# Altium integrated library Lattice CPLD ispLSI.IntLib: 471 symbols (part 24 of 26) (continued)
## ispLSI8840V-60LB492 (continued)
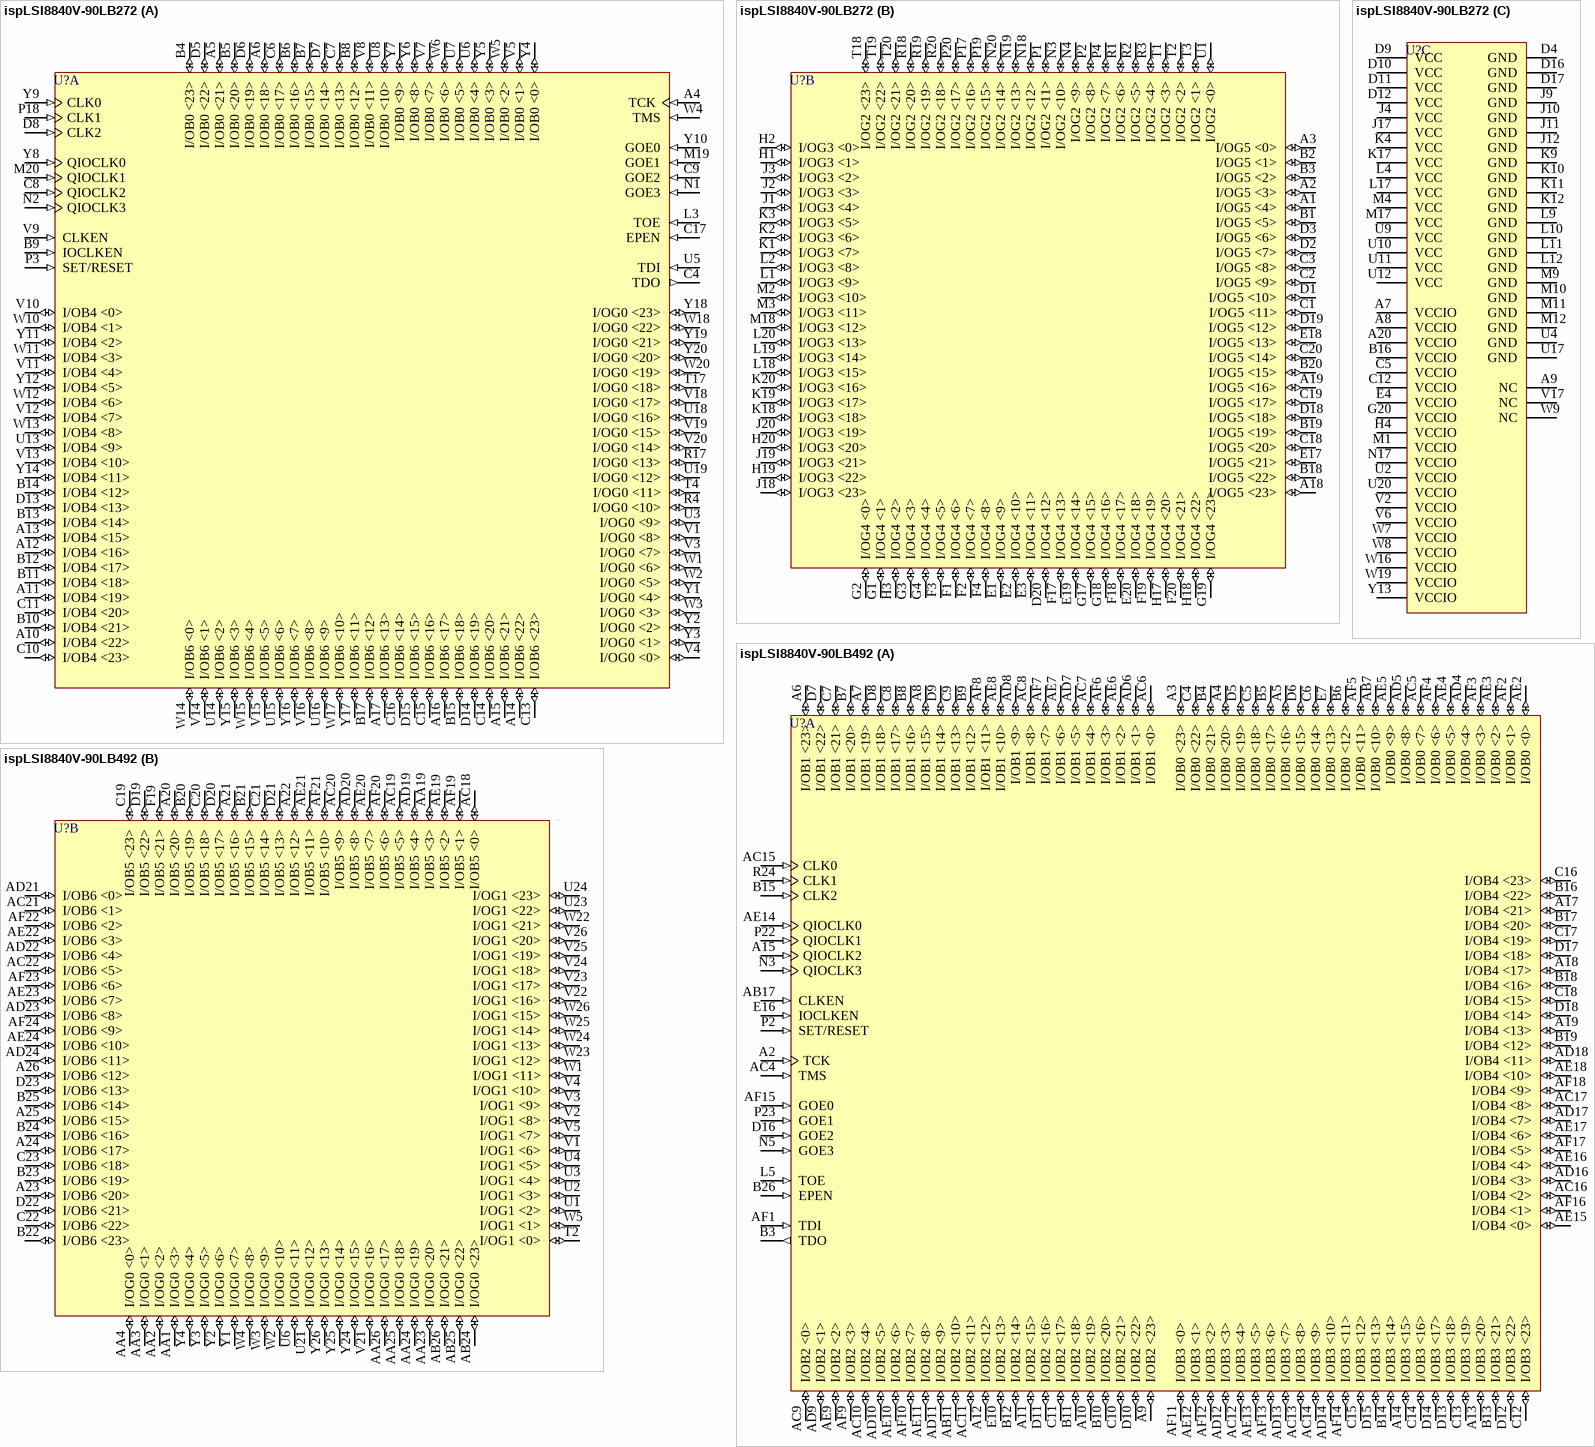
[diagram p223: symbols ispLSI8840V-90LB272 to ispLSI8840V-90LB492]

## ispLSI8840V-90LB272
designator U?
3.3V In-System Programmable SuperBIG High Density PLD; Published: 17-Jul-2002; LatestRevisionDate: 13-Apr-2006; LatestRevisionNote: IPC-7351 Footprint Added.; DatasheetVersion: Nov-2000; PackageVersion: pkg_32, Aug-2005; PackageReference: BGA272; Publisher: Altium Limited; PackageDescription: 272-Ball Ball Grid Array (BGA272); ComponentLink1Description: Manufacturer Link; ComponentLink1URL: http://www.latticesemi.com/products/mature/index.cfm; ComponentLink2Description: Datasheet; ComponentLink2URL: http://www.latticesemi.com/lit/docs/datasheets/cpld/8840v.pdf
footprint BGA272 (BGA, 272-Leads, Body 27x27mm, Pitch 1.27mm)
3D model 8840V-BGA272 (272-Ball Ball Grid Array (BGA272))
part A pins: A4 TCK (in), A5 I/OB0 <21> (io), A6 I/OB0 <18> (io), A10 I/OB4 <22> (io), A11 I/OB4 <19> (io), A12 I/OB4 <16> (io), A13 I/OB4 <15> (io), A14 I/OB6 <22> (io), A15 I/OB6 <21> (io), A16 I/OB6 <17> (io), A17 I/OB6 <13> (io), B4 I/OB0 <23> (io), B5 I/OB0 <20> (io), B6 I/OB0 <16> (io), B7 I/OB0 <15> (io), B8 I/OB0 <12> (io), B9 IOCLKEN (in), B10 I/OB4 <21> (io), B11 I/OB4 <18> (io), B12 I/OB4 <17> (io), B13 I/OB4 <14> (io), B14 I/OB4 <12> (io), B15 I/OB6 <18> (io), B17 I/OB6 <12> (io), C4 TDO (out), C6 I/OB0 <17> (io), C7 I/OB0 <13> (io), C8 QIOCLK2 (in), C9 GOE2 (in), C10 I/OB4 <23> (io), C11 I/OB4 <20> (io), C13 I/OB6 <23> (io), C14 I/OB6 <20> (io), C15 I/OB6 <16> (io), C16 I/OB6 <14> (io), C17 EPEN (in), D5 I/OB0 <22> (io), D6 I/OB0 <19> (io), D7 I/OB0 <14> (io), D8 CLK2 (in), D13 I/OB4 <13> (io), D14 I/OB6 <19> (io), D15 I/OB6 <15> (io), L3 TOE (in), M19 GOE1 (in), M20 QIOCLK1 (in), N1 GOE3 (in), N2 QIOCLK3 (in), P3 SET/RESET (in), P18 CLK1 (in), R4 I/OG0 <10> (io), R17 I/OG0 <13> (io), T4 I/OG0 <11> (io), T17 I/OG0 <18> (io), U3 I/OG0 <9> (io), U5 TDI (in), U6 I/OB0 <4> (io), U7 I/OB0 <5> (io), U8 I/OB0 <10> (io), U13 I/OB4 <9> (io), U14 I/OB6 <2> (io), U15 I/OB6 <6> (io), U16 I/OB6 <9> (io), U18 I/OG0 <16> (io), U19 I/OG0 <12> (io), V1 I/OG0 <8> (io), V3 I/OG0 <7> (io), V4 I/OG0 <0> (io), V5 I/OB0 <1> (io), V7 I/OB0 <7> (io), V8 I/OB0 <11> (io), V9 CLKEN (in), V10 I/OB4 <0> (io), V11 I/OB4 <4> (io), V12 I/OB4 <7> (io), V13 I/OB4 <10> (io), V14 I/OB6 <1> (io), V15 I/OB6 <5> (io), V16 I/OB6 <8> (io), V18 I/OG0 <17> (io), V19 I/OG0 <15> (io), V20 I/OG0 <14> (io), W1 I/OG0 <6> (io), W2 I/OG0 <5> (io), W3 I/OG0 <3> (io), W4 TMS (in), W5 I/OB0 <2> (io), W6 I/OB0 <6> (io), W10 I/OB4 <1> (io), W11 I/OB4 <3> (io), W12 I/OB4 <6> (io), W13 I/OB4 <8> (io), W14 I/OB6 <0> (io), W15 I/OB6 <4> (io), W17 I/OB6 <10> (io), W18 I/OG0 <22> (io), W20 I/OG0 <19> (io), Y1 I/OG0 <4> (io), Y2 I/OG0 <2> (io), Y3 I/OG0 <1> (io), Y4 I/OB0 <0> (io), Y5 I/OB0 <3> (io), Y6 I/OB0 <8> (io), Y7 I/OB0 <9> (io), Y8 QIOCLK0 (in), Y9 CLK0 (in), Y10 GOE0 (in), Y11 I/OB4 <2> (io), Y12 I/OB4 <5> (io), Y14 I/OB4 <11> (io), Y15 I/OB6 <3> (io), Y16 I/OB6 <7> (io), Y17 I/OB6 <11> (io), Y18 I/OG0 <23> (io), Y19 I/OG0 <21> (io), Y20 I/OG0 <20> (io)
part B pins: A1 I/OG5 <4> (io), A2 I/OG5 <3> (io), A3 I/OG5 <0> (io), A18 I/OG5 <23> (io), A19 I/OG5 <16> (io), B1 I/OG5 <5> (io), B2 I/OG5 <1> (io), B3 I/OG5 <2> (io), B18 I/OG5 <22> (io), B19 I/OG5 <19> (io), B20 I/OG5 <15> (io), C1 I/OG5 <11> (io), C2 I/OG5 <9> (io), C3 I/OG5 <8> (io), C18 I/OG5 <20> (io), C19 I/OG5 <17> (io), C20 I/OG5 <14> (io), D1 I/OG5 <10> (io), D2 I/OG5 <7> (io), D3 I/OG5 <6> (io), D18 I/OG5 <18> (io), D19 I/OG5 <12> (io), D20 I/OG4 <12> (io), E1 I/OG4 <9> (io), E2 I/OG4 <10> (io), E3 I/OG4 <11> (io), E17 I/OG5 <21> (io), E18 I/OG5 <13> (io), E19 I/OG4 <14> (io), E20 I/OG4 <18> (io), F1 I/OG4 <6> (io), F2 I/OG4 <7> (io), F3 I/OG4 <5> (io), F4 I/OG4 <8> (io), F17 I/OG4 <13> (io), F18 I/OG4 <17> (io), F19 I/OG4 <19> (io), F20 I/OG4 <21> (io), G1 I/OG4 <1> (io), G2 I/OG4 <0> (io), G3 I/OG4 <3> (io), G4 I/OG4 <4> (io), G17 I/OG4 <15> (io), G18 I/OG4 <16> (io), G19 I/OG4 <23> (io), H1 I/OG3 <1> (io), H2 I/OG3 <0> (io), H3 I/OG4 <2> (io), H17 I/OG4 <20> (io), H18 I/OG4 <22> (io), H19 I/OG3 <22> (io), H20 I/OG3 <20> (io), J1 I/OG3 <4> (io), J2 I/OG3 <3> (io), J3 I/OG3 <2> (io), J18 I/OG3 <23> (io), J19 I/OG3 <21> (io), J20 I/OG3 <19> (io), K1 I/OG3 <7> (io), K2 I/OG3 <6> (io), K3 I/OG3 <5> (io), K18 I/OG3 <18> (io), K19 I/OG3 <17> (io), K20 I/OG3 <16> (io), L1 I/OG3 <9> (io), L2 I/OG3 <8> (io), L18 I/OG3 <15> (io), L19 I/OG3 <14> (io), L20 I/OG3 <13> (io), M2 I/OG3 <10> (io), M3 I/OG3 <11> (io), M18 I/OG3 <12> (io), N3 I/OG2 <10> (io), N4 I/OG2 <9> (io), N18 I/OG2 <12> (io), N19 I/OG2 <13> (io), N20 I/OG2 <14> (io), P1 I/OG2 <11> (io), P2 I/OG2 <8> (io), P4 I/OG2 <7> (io), P17 I/OG2 <16> (io), P19 I/OG2 <15> (io), P20 I/OG2 <17> (io), R1 I/OG2 <6> (io), R2 I/OG2 <5> (io), R3 I/OG2 <4> (io), R18 I/OG2 <20> (io), R19 I/OG2 <19> (io), R20 I/OG2 <18> (io), T1 I/OG2 <3> (io), T2 I/OG2 <2> (io), T3 I/OG2 <1> (io), T18 I/OG2 <23> (io), T19 I/OG2 <22> (io), T20 I/OG2 <21> (io), U1 I/OG2 <0> (io)
part C pins: A7 VCCIO (power), A8 VCCIO (power), A9 NC, A20 VCCIO (power), B16 VCCIO (power), C5 VCCIO (power), C12 VCCIO (power), D4 GND (power), D9 VCC (power), D10 VCC (power), D11 VCC (power), D12 VCC (power), D16 GND (power), D17 GND (power), E4 VCCIO (power), G20 VCCIO (power), H4 VCCIO (power), J4 VCC (power), J9 GND (power), J10 GND (power), J11 GND (power), J12 GND (power), J17 VCC (power), K4 VCC (power), K9 GND (power), K10 GND (power), K11 GND (power), K12 GND (power), K17 VCC (power), L4 VCC (power), L9 GND (power), L10 GND (power), L11 GND (power), L12 GND (power), L17 VCC (power), M1 VCCIO (power), M4 VCC (power), M9 GND (power), M10 GND (power), M11 GND (power), M12 GND (power), M17 VCC (power), N17 VCCIO (power), U2 VCCIO (power), U4 GND (power), U9 VCC (power), U10 VCC (power), U11 VCC (power), U12 VCC (power), U17 GND (power), U20 VCCIO (power), V2 VCCIO (power), V6 VCCIO (power), V17 NC, W7 VCCIO (power), W8 VCCIO (power), W9 NC, W16 VCCIO (power), W19 VCCIO (power), Y13 VCCIO (power)

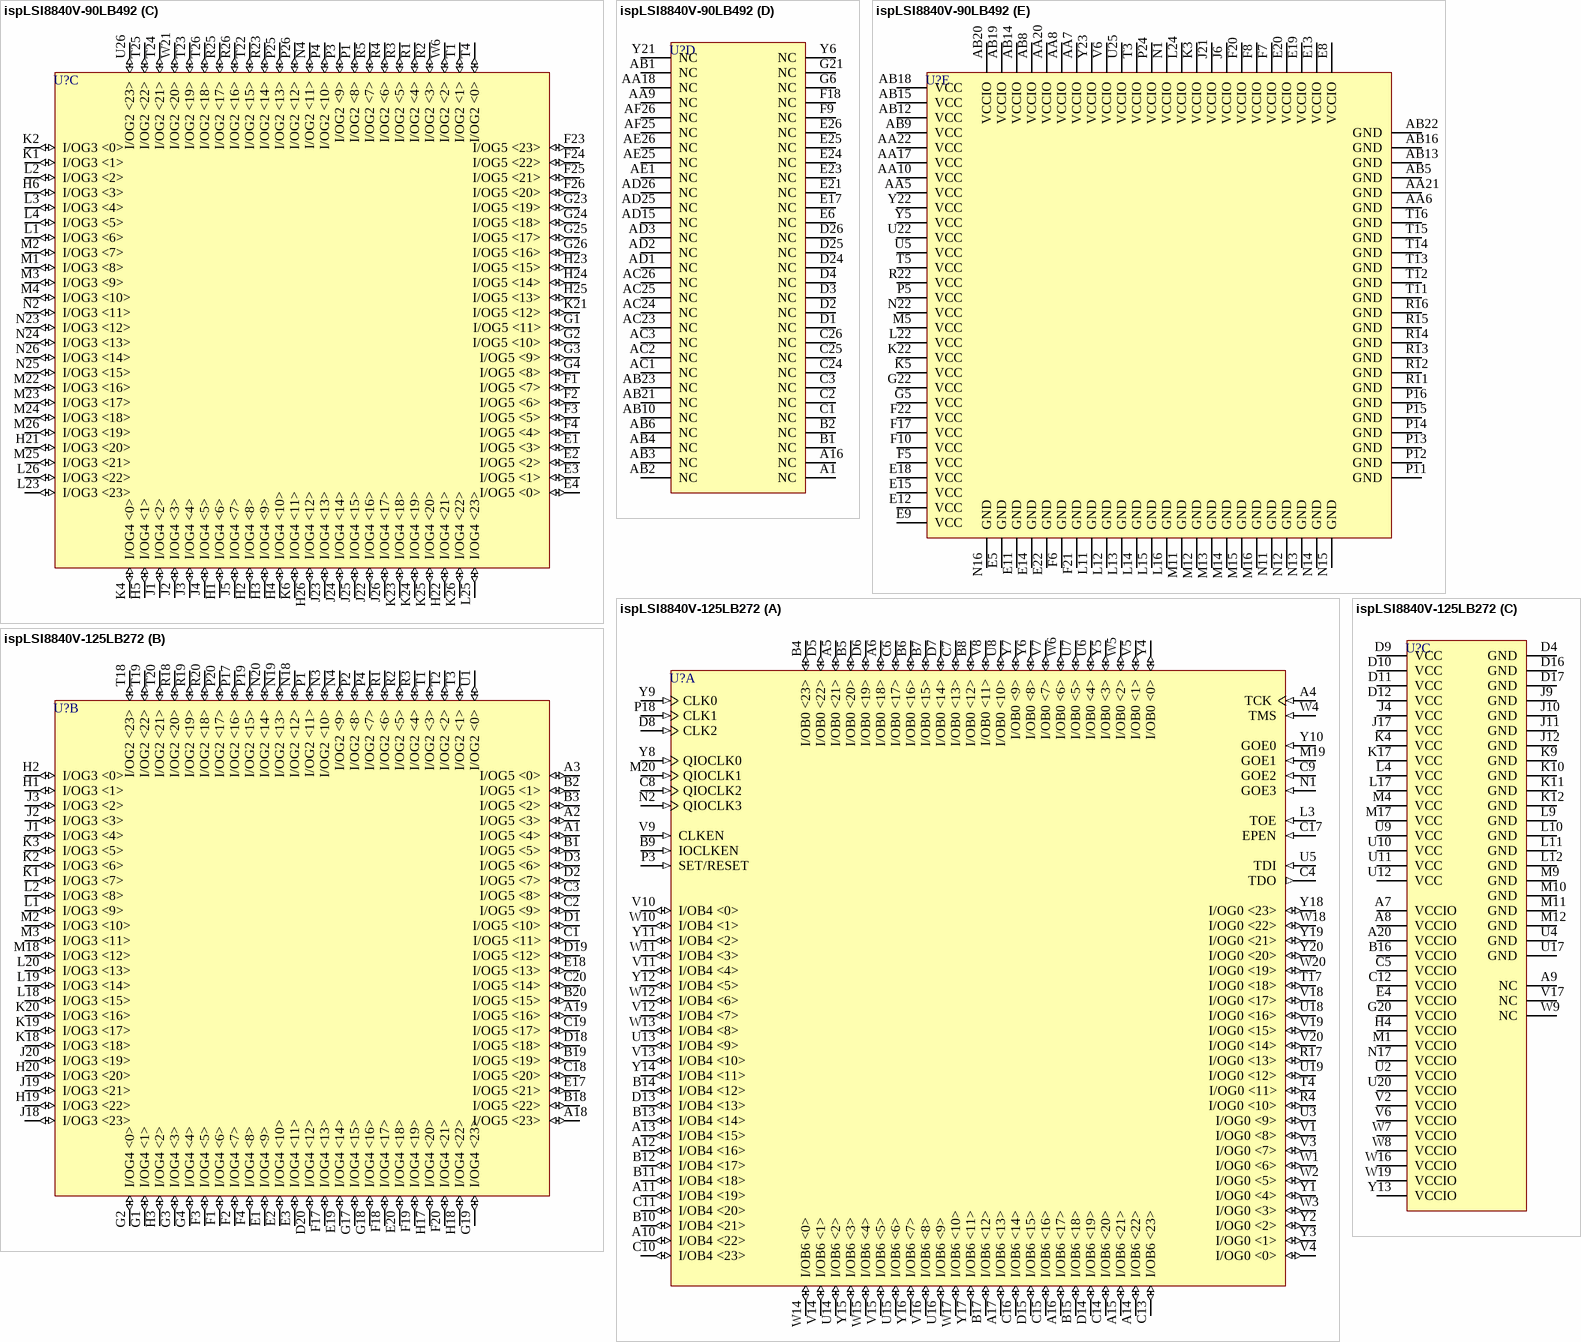
[diagram p224: symbols ispLSI8840V-90LB492 to ispLSI8840V-125LB272]

## ispLSI8840V-90LB492
designator U?
3.3V In-System Programmable SuperBIG High Density PLD; Published: 17-Jul-2002; LatestRevisionDate: 13-Apr-2006; LatestRevisionNote: IPC-7351 Footprint Added.; DatasheetVersion: Nov-2000; PackageVersion: pkg_32, Aug-2005; PackageReference: BGA492; Publisher: Altium Limited; PackageDescription: 492-Ball Ball Grid Array (BGA492); ComponentLink1Description: Manufacturer Link; ComponentLink1URL: http://www.latticesemi.com/products/mature/index.cfm; ComponentLink2Description: Datasheet; ComponentLink2URL: http://www.latticesemi.com/lit/docs/datasheets/cpld/8840v.pdf
footprint BGA492 (BGA, 492-Leads, Body 35x35mm, Pitch 1.27mm)
3D model 8840V-BGA492 (492-Ball Ball Grid Array (BGA492))
part A pins: A2 TCK (in), A3 I/OB0 <23> (io), A4 I/OB0 <20> (io), A5 I/OB0 <16> (io), A6 I/OB1 <23> (io), A7 I/OB1 <19> (io), A8 I/OB1 <15> (io), A9 I/OB2 <23> (io), A10 I/OB2 <19> (io), A11 I/OB2 <15> (io), A12 I/OB2 <12> (io), A13 I/OB3 <20> (io), A14 I/OB3 <15> (io), A15 QIOCLK2 (in), A17 I/OB4 <21> (io), A18 I/OB4 <17> (io), A19 I/OB4 <13> (io), AB7 I/OB0 <10> (io), AB11 I/OB2 <10> (io), AB17 CLKEN (in), AC4 TMS (in), AC5 I/OB0 <7> (io), AC6 I/OB1 <0> (io), AC7 I/OB1 <4> (io), AC8 I/OB1 <8> (io), AC9 I/OB2 <0> (io), AC10 I/OB2 <4> (io), AC11 I/OB2 <11> (io), AC12 I/OB3 <4> (io), AC13 I/OB3 <8> (io), AC14 I/OB3 <9> (io), AC15 CLK0 (in), AC16 I/OB4 <2> (io), AC17 I/OB4 <8> (io), AD4 I/OB0 <4> (io), AD5 I/OB0 <8> (io), AD6 I/OB1 <1> (io), AD7 I/OB1 <5> (io), AD8 I/OB1 <9> (io), AD9 I/OB2 <1> (io), AD10 I/OB2 <5> (io), AD11 I/OB2 <9> (io), AD12 I/OB3 <3> (io), AD13 I/OB3 <7> (io), AD14 I/OB3 <10> (io), AD16 I/OB4 <3> (io), AD17 I/OB4 <7> (io), AD18 I/OB4 <11> (io), AE2 I/OB0 <0> (io), AE3 I/OB0 <2> (io), AE4 I/OB0 <5> (io), AE5 I/OB0 <9> (io), AE6 I/OB1 <2> (io), AE7 I/OB1 <6> (io), AE8 I/OB1 <10> (io), AE9 I/OB2 <2> (io), AE10 I/OB2 <6> (io), AE11 I/OB2 <8> (io), AE12 I/OB3 <1> (io), AE13 I/OB3 <5> (io), AE14 QIOCLK0 (in), AE15 I/OB4 <0> (io), AE16 I/OB4 <4> (io), AE17 I/OB4 <6> (io), AE18 I/OB4 <10> (io), AF1 TDI (in), AF2 I/OB0 <1> (io), AF3 I/OB0 <3> (io), AF4 I/OB0 <6> (io), AF5 I/OB0 <11> (io), AF6 I/OB1 <3> (io), AF7 I/OB1 <7> (io), AF8 I/OB1 <11> (io), AF9 I/OB2 <3> (io), AF10 I/OB2 <7> (io), AF11 I/OB3 <0> (io), AF12 I/OB3 <2> (io), AF13 I/OB3 <6> (io), AF14 I/OB3 <11> (io), AF15 GOE0 (in), AF16 I/OB4 <1> (io), AF17 I/OB4 <5> (io), AF18 I/OB4 <9> (io), B3 TDO (out), B4 I/OB0 <21> (io), B5 I/OB0 <17> (io), B6 I/OB0 <12> (io), B7 I/OB1 <20> (io), B8 I/OB1 <16> (io), B9 I/OB1 <12> (io), B10 I/OB2 <20> (io), B11 I/OB2 <18> (io), B12 I/OB2 <14> (io), B13 I/OB3 <21> (io), B14 I/OB3 <14> (io), B15 CLK2 (in), B16 I/OB4 <22> (io), B17 I/OB4 <20> (io), B18 I/OB4 <16> (io), B19 I/OB4 <12> (io), B26 EPEN (in), C4 I/OB0 <22> (io), C5 I/OB0 <18> (io), C6 I/OB0 <14> (io), C7 I/OB1 <21> (io), C8 I/OB1 <17> (io), C9 I/OB1 <13> (io), C10 I/OB2 <21> (io), C11 I/OB2 <17> (io), C12 I/OB3 <23> (io), C13 I/OB3 <19> (io), C14 I/OB3 <16> (io), C15 I/OB3 <12> (io), C16 I/OB4 <23> (io), C17 I/OB4 <19> (io), C18 I/OB4 <15> (io), D5 I/OB0 <19> (io), D6 I/OB0 <15> (io), D7 I/OB1 <22> (io), D8 I/OB1 <18> (io), D9 I/OB1 <14> (io), D10 I/OB2 <22> (io), D11 I/OB2 <16> (io), D12 I/OB3 <22> (io), D13 I/OB3 <18> (io), D14 I/OB3 <17> (io), D15 I/OB3 <13> (io), D16 GOE2 (in), D17 I/OB4 <18> (io), D18 I/OB4 <14> (io), E7 I/OB0 <13> (io), E10 I/OB2 <13> (io), E16 IOCLKEN (in), L5 TOE (in), N3 QIOCLK3 (in), N5 GOE3 (in), P2 SET/RESET (in), P22 QIOCLK1 (in), P23 GOE1 (in), R24 CLK1 (in)
part B pins: A20 I/OB5 <20> (io), A21 I/OB5 <16> (io), A22 I/OB5 <12> (io), A23 I/OB6 <20> (io), A24 I/OB6 <17> (io), A25 I/OB6 <15> (io), A26 I/OB6 <12> (io), AA1 I/OG0 <3> (io), AA2 I/OG0 <2> (io), AA3 I/OG0 <1> (io), AA4 I/OG0 <0> (io), AA19 I/OB5 <3> (io), AA23 I/OG0 <20> (io), AA24 I/OG0 <19> (io), AA25 I/OG0 <18> (io), AA26 I/OG0 <17> (io), AB24 I/OG0 <23> (io), AB25 I/OG0 <22> (io), AB26 I/OG0 <21> (io), AC18 I/OB5 <0> (io), AC19 I/OB5 <5> (io), AC20 I/OB5 <9> (io), AC21 I/OB6 <1> (io), AC22 I/OB6 <5> (io), AD19 I/OB5 <4> (io), AD20 I/OB5 <8> (io), AD21 I/OB6 <0> (io), AD22 I/OB6 <4> (io), AD23 I/OB6 <8> (io), AD24 I/OB6 <11> (io), AE19 I/OB5 <2> (io), AE20 I/OB5 <7> (io), AE21 I/OB5 <11> (io), AE22 I/OB6 <3> (io), AE23 I/OB6 <7> (io), AE24 I/OB6 <10> (io), AF19 I/OB5 <1> (io), AF20 I/OB5 <6> (io), AF21 I/OB5 <10> (io), AF22 I/OB6 <2> (io), AF23 I/OB6 <6> (io), AF24 I/OB6 <9> (io), B20 I/OB5 <19> (io), B21 I/OB5 <15> (io), B22 I/OB6 <23> (io), B23 I/OB6 <19> (io), B24 I/OB6 <16> (io), B25 I/OB6 <14> (io), C19 I/OB5 <23> (io), C20 I/OB5 <18> (io), C21 I/OB5 <14> (io), C22 I/OB6 <22> (io), C23 I/OB6 <18> (io), D19 I/OB5 <22> (io), D20 I/OB5 <17> (io), D21 I/OB5 <13> (io), D22 I/OB6 <21> (io), D23 I/OB6 <13> (io), F19 I/OB5 <21> (io), T2 I/OG1 <0> (io), U1 I/OG1 <2> (io), U2 I/OG1 <3> (io), U3 I/OG1 <4> (io), U4 I/OG1 <5> (io), U6 I/OG0 <11> (io), U21 I/OG0 <12> (io), U23 I/OG1 <22> (io), U24 I/OG1 <23> (io), V1 I/OG1 <6> (io), V2 I/OG1 <8> (io), V3 I/OG1 <9> (io), V4 I/OG1 <10> (io), V5 I/OG1 <7> (io), V21 I/OG0 <16> (io), V22 I/OG1 <16> (io), V23 I/OG1 <17> (io), V24 I/OG1 <18> (io), V25 I/OG1 <19> (io), V26 I/OG1 <20> (io), W1 I/OG1 <11> (io), W2 I/OG0 <10> (io), W3 I/OG0 <9> (io), W4 I/OG0 <8> (io), W5 I/OG1 <1> (io), W22 I/OG1 <21> (io), W23 I/OG1 <12> (io), W24 I/OG1 <13> (io), W25 I/OG1 <14> (io), W26 I/OG1 <15> (io), Y1 I/OG0 <7> (io), Y2 I/OG0 <6> (io), Y3 I/OG0 <5> (io), Y4 I/OG0 <4> (io), Y24 I/OG0 <15> (io), Y25 I/OG0 <14> (io), Y26 I/OG0 <13> (io)
part C pins: E1 I/OG5 <3> (io), E2 I/OG5 <2> (io), E3 I/OG5 <1> (io), E4 I/OG5 <0> (io), F1 I/OG5 <7> (io), F2 I/OG5 <6> (io), F3 I/OG5 <5> (io), F4 I/OG5 <4> (io), F23 I/OG5 <23> (io), F24 I/OG5 <22> (io), F25 I/OG5 <21> (io), F26 I/OG5 <20> (io), G1 I/OG5 <11> (io), G2 I/OG5 <10> (io), G3 I/OG5 <9> (io), G4 I/OG5 <8> (io), G23 I/OG5 <19> (io), G24 I/OG5 <18> (io), G25 I/OG5 <17> (io), G26 I/OG5 <16> (io), H1 I/OG4 <6> (io), H2 I/OG4 <8> (io), H3 I/OG4 <9> (io), H4 I/OG4 <10> (io), H5 I/OG4 <1> (io), H6 I/OG3 <3> (io), H21 I/OG3 <20> (io), H22 I/OG4 <21> (io), H23 I/OG5 <15> (io), H24 I/OG5 <14> (io), H25 I/OG5 <13> (io), H26 I/OG4 <12> (io), J1 I/OG4 <2> (io), J2 I/OG4 <3> (io), J3 I/OG4 <4> (io), J4 I/OG4 <5> (io), J5 I/OG4 <7> (io), J22 I/OG4 <16> (io), J23 I/OG4 <13> (io), J24 I/OG4 <14> (io), J25 I/OG4 <15> (io), J26 I/OG4 <17> (io), K1 I/OG3 <1> (io), K2 I/OG3 <0> (io), K4 I/OG4 <0> (io), K6 I/OG4 <11> (io), K21 I/OG5 <12> (io), K23 I/OG4 <18> (io), K24 I/OG4 <19> (io), K25 I/OG4 <20> (io), K26 I/OG4 <22> (io), L1 I/OG3 <6> (io), L2 I/OG3 <2> (io), L3 I/OG3 <4> (io), L4 I/OG3 <5> (io), L23 I/OG3 <23> (io), L25 I/OG4 <23> (io), L26 I/OG3 <22> (io), M1 I/OG3 <8> (io), M2 I/OG3 <7> (io), M3 I/OG3 <9> (io), M4 I/OG3 <10> (io), M22 I/OG3 <16> (io), M23 I/OG3 <17> (io), M24 I/OG3 <18> (io), M25 I/OG3 <21> (io), M26 I/OG3 <19> (io), N2 I/OG3 <11> (io), N4 I/OG2 <11> (io), N23 I/OG3 <12> (io), N24 I/OG3 <13> (io), N25 I/OG3 <15> (io), N26 I/OG3 <14> (io), P1 I/OG2 <8> (io), P3 I/OG2 <9> (io), P4 I/OG2 <10> (io), P25 I/OG2 <13> (io), P26 I/OG2 <12> (io), R1 I/OG2 <4> (io), R2 I/OG2 <3> (io), R3 I/OG2 <5> (io), R4 I/OG2 <6> (io), R5 I/OG2 <7> (io), R23 I/OG2 <14> (io), R25 I/OG2 <17> (io), R26 I/OG2 <16> (io), T1 I/OG2 <1> (io), T4 I/OG2 <0> (io), T22 I/OG2 <15> (io), T23 I/OG2 <19> (io), T24 I/OG2 <21> (io), T25 I/OG2 <22> (io), T26 I/OG2 <18> (io), U26 I/OG2 <23> (io), W6 I/OG2 <2> (io), W21 I/OG2 <20> (io)
part D pins: A1 NC, A16 NC, AA9 NC, AA18 NC, AB1 NC, AB2 NC, AB3 NC, AB4 NC, AB6 NC, AB10 NC, AB21 NC, AB23 NC, AC1 NC, AC2 NC, AC3 NC, AC23 NC, AC24 NC, AC25 NC, AC26 NC, AD1 NC, AD2 NC, AD3 NC, AD15 NC, AD25 NC, AD26 NC, AE1 NC, AE25 NC, AE26 NC, AF25 NC, AF26 NC, B1 NC, B2 NC, C1 NC, C2 NC, C3 NC, C24 NC, C25 NC, C26 NC, D1 NC, D2 NC, D3 NC, D4 NC, D24 NC, D25 NC, D26 NC, E6 NC, E17 NC, E21 NC, E23 NC, E24 NC, E25 NC, E26 NC, F9 NC, F18 NC, G6 NC, G21 NC, Y6 NC, Y21 NC
part E pins: AA5 VCC (power), AA6 GND (power), AA7 VCCIO (power), AA8 VCCIO (power), AA10 VCC (power), AA17 VCC (power), AA20 VCCIO (power), AA21 GND (power), AA22 VCC (power), AB5 GND (power), AB8 VCCIO (power), AB9 VCC (power), AB12 VCC (power), AB13 GND (power), AB14 VCCIO (power), AB15 VCC (power), AB16 GND (power), AB18 VCC (power), AB19 VCCIO (power), AB20 VCCIO (power), AB22 GND (power), E5 GND (power), E8 VCCIO (power), E9 VCC (power), E11 GND (power), E12 VCC (power), E13 VCCIO (power), E14 GND (power), E15 VCC (power), E18 VCC (power), E19 VCCIO (power), E20 VCCIO (power), E22 GND (power), F5 VCC (power), F6 GND (power), F7 VCCIO (power), F8 VCCIO (power), F10 VCC (power), F17 VCC (power), F20 VCCIO (power), F21 GND (power), F22 VCC (power), G5 VCC (power), G22 VCC (power), J6 VCCIO (power), J21 VCCIO (power), K3 VCCIO (power), K5 VCC (power), K22 VCC (power), L11 GND (power), L12 GND (power), L13 GND (power), L14 GND (power), L15 GND (power), L16 GND (power), L22 VCC (power), L24 VCCIO (power), M5 VCC (power), M11 GND (power), M12 GND (power), M13 GND (power), M14 GND (power), M15 GND (power), M16 GND (power), N1 VCCIO (power), N11 GND (power), N12 GND (power), N13 GND (power), N14 GND (power), N15 GND (power), N16 GND (power), N22 VCC (power), P5 VCC (power), P11 GND (power), P12 GND (power), P13 GND (power), P14 GND (power), P15 GND (power), P16 GND (power), P24 VCCIO (power), R11 GND (power), R12 GND (power), R13 GND (power), R14 GND (power), R15 GND (power), R16 GND (power), R22 VCC (power), T3 VCCIO (power), T5 VCC (power), T11 GND (power), T12 GND (power), T13 GND (power), T14 GND (power), T15 GND (power), T16 GND (power), U5 VCC (power), U22 VCC (power), U25 VCCIO (power), V6 VCCIO (power), Y5 VCC (power), Y22 VCC (power), Y23 VCCIO (power)

## ispLSI8840V-125LB272
designator U?
3.3V In-System Programmable SuperBIG High Density PLD; Published: 17-Jul-2002; LatestRevisionDate: 13-Apr-2006; LatestRevisionNote: IPC-7351 Footprint Added.; DatasheetVersion: Nov-2000; PackageVersion: pkg_32, Aug-2005; PackageReference: BGA272; Publisher: Altium Limited; PackageDescription: 272-Ball Ball Grid Array (BGA272); ComponentLink1Description: Manufacturer Link; ComponentLink1URL: http://www.latticesemi.com/products/mature/index.cfm; ComponentLink2Description: Datasheet; ComponentLink2URL: http://www.latticesemi.com/lit/docs/datasheets/cpld/8840v.pdf
footprint BGA272 (BGA, 272-Leads, Body 27x27mm, Pitch 1.27mm)
3D model 8840V-BGA272 (272-Ball Ball Grid Array (BGA272))
part A pins: A4 TCK (in), A5 I/OB0 <21> (io), A6 I/OB0 <18> (io), A10 I/OB4 <22> (io), A11 I/OB4 <19> (io), A12 I/OB4 <16> (io), A13 I/OB4 <15> (io), A14 I/OB6 <22> (io), A15 I/OB6 <21> (io), A16 I/OB6 <17> (io), A17 I/OB6 <13> (io), B4 I/OB0 <23> (io), B5 I/OB0 <20> (io), B6 I/OB0 <16> (io), B7 I/OB0 <15> (io), B8 I/OB0 <12> (io), B9 IOCLKEN (in), B10 I/OB4 <21> (io), B11 I/OB4 <18> (io), B12 I/OB4 <17> (io), B13 I/OB4 <14> (io), B14 I/OB4 <12> (io), B15 I/OB6 <18> (io), B17 I/OB6 <12> (io), C4 TDO (out), C6 I/OB0 <17> (io), C7 I/OB0 <13> (io), C8 QIOCLK2 (in), C9 GOE2 (in), C10 I/OB4 <23> (io), C11 I/OB4 <20> (io), C13 I/OB6 <23> (io), C14 I/OB6 <20> (io), C15 I/OB6 <16> (io), C16 I/OB6 <14> (io), C17 EPEN (in), D5 I/OB0 <22> (io), D6 I/OB0 <19> (io), D7 I/OB0 <14> (io), D8 CLK2 (in), D13 I/OB4 <13> (io), D14 I/OB6 <19> (io), D15 I/OB6 <15> (io), L3 TOE (in), M19 GOE1 (in), M20 QIOCLK1 (in), N1 GOE3 (in), N2 QIOCLK3 (in), P3 SET/RESET (in), P18 CLK1 (in), R4 I/OG0 <10> (io), R17 I/OG0 <13> (io), T4 I/OG0 <11> (io), T17 I/OG0 <18> (io), U3 I/OG0 <9> (io), U5 TDI (in), U6 I/OB0 <4> (io), U7 I/OB0 <5> (io), U8 I/OB0 <10> (io), U13 I/OB4 <9> (io), U14 I/OB6 <2> (io), U15 I/OB6 <6> (io), U16 I/OB6 <9> (io), U18 I/OG0 <16> (io), U19 I/OG0 <12> (io), V1 I/OG0 <8> (io), V3 I/OG0 <7> (io), V4 I/OG0 <0> (io), V5 I/OB0 <1> (io), V7 I/OB0 <7> (io), V8 I/OB0 <11> (io), V9 CLKEN (in), V10 I/OB4 <0> (io), V11 I/OB4 <4> (io), V12 I/OB4 <7> (io), V13 I/OB4 <10> (io), V14 I/OB6 <1> (io), V15 I/OB6 <5> (io), V16 I/OB6 <8> (io), V18 I/OG0 <17> (io), V19 I/OG0 <15> (io), V20 I/OG0 <14> (io), W1 I/OG0 <6> (io), W2 I/OG0 <5> (io), W3 I/OG0 <3> (io), W4 TMS (in), W5 I/OB0 <2> (io), W6 I/OB0 <6> (io), W10 I/OB4 <1> (io), W11 I/OB4 <3> (io), W12 I/OB4 <6> (io), W13 I/OB4 <8> (io), W14 I/OB6 <0> (io), W15 I/OB6 <4> (io), W17 I/OB6 <10> (io), W18 I/OG0 <22> (io), W20 I/OG0 <19> (io), Y1 I/OG0 <4> (io), Y2 I/OG0 <2> (io), Y3 I/OG0 <1> (io), Y4 I/OB0 <0> (io), Y5 I/OB0 <3> (io), Y6 I/OB0 <8> (io), Y7 I/OB0 <9> (io), Y8 QIOCLK0 (in), Y9 CLK0 (in), Y10 GOE0 (in), Y11 I/OB4 <2> (io), Y12 I/OB4 <5> (io), Y14 I/OB4 <11> (io), Y15 I/OB6 <3> (io), Y16 I/OB6 <7> (io), Y17 I/OB6 <11> (io), Y18 I/OG0 <23> (io), Y19 I/OG0 <21> (io), Y20 I/OG0 <20> (io)
part B pins: A1 I/OG5 <4> (io), A2 I/OG5 <3> (io), A3 I/OG5 <0> (io), A18 I/OG5 <23> (io), A19 I/OG5 <16> (io), B1 I/OG5 <5> (io), B2 I/OG5 <1> (io), B3 I/OG5 <2> (io), B18 I/OG5 <22> (io), B19 I/OG5 <19> (io), B20 I/OG5 <15> (io), C1 I/OG5 <11> (io), C2 I/OG5 <9> (io), C3 I/OG5 <8> (io), C18 I/OG5 <20> (io), C19 I/OG5 <17> (io), C20 I/OG5 <14> (io), D1 I/OG5 <10> (io), D2 I/OG5 <7> (io), D3 I/OG5 <6> (io), D18 I/OG5 <18> (io), D19 I/OG5 <12> (io), D20 I/OG4 <12> (io), E1 I/OG4 <9> (io), E2 I/OG4 <10> (io), E3 I/OG4 <11> (io), E17 I/OG5 <21> (io), E18 I/OG5 <13> (io), E19 I/OG4 <14> (io), E20 I/OG4 <18> (io), F1 I/OG4 <6> (io), F2 I/OG4 <7> (io), F3 I/OG4 <5> (io), F4 I/OG4 <8> (io), F17 I/OG4 <13> (io), F18 I/OG4 <17> (io), F19 I/OG4 <19> (io), F20 I/OG4 <21> (io), G1 I/OG4 <1> (io), G2 I/OG4 <0> (io), G3 I/OG4 <3> (io), G4 I/OG4 <4> (io), G17 I/OG4 <15> (io), G18 I/OG4 <16> (io), G19 I/OG4 <23> (io), H1 I/OG3 <1> (io), H2 I/OG3 <0> (io), H3 I/OG4 <2> (io), H17 I/OG4 <20> (io), H18 I/OG4 <22> (io), H19 I/OG3 <22> (io), H20 I/OG3 <20> (io), J1 I/OG3 <4> (io), J2 I/OG3 <3> (io), J3 I/OG3 <2> (io), J18 I/OG3 <23> (io), J19 I/OG3 <21> (io), J20 I/OG3 <19> (io), K1 I/OG3 <7> (io), K2 I/OG3 <6> (io), K3 I/OG3 <5> (io), K18 I/OG3 <18> (io), K19 I/OG3 <17> (io), K20 I/OG3 <16> (io), L1 I/OG3 <9> (io), L2 I/OG3 <8> (io), L18 I/OG3 <15> (io), L19 I/OG3 <14> (io), L20 I/OG3 <13> (io), M2 I/OG3 <10> (io), M3 I/OG3 <11> (io), M18 I/OG3 <12> (io), N3 I/OG2 <10> (io), N4 I/OG2 <9> (io), N18 I/OG2 <12> (io), N19 I/OG2 <13> (io), N20 I/OG2 <14> (io), P1 I/OG2 <11> (io), P2 I/OG2 <8> (io), P4 I/OG2 <7> (io), P17 I/OG2 <16> (io), P19 I/OG2 <15> (io), P20 I/OG2 <17> (io), R1 I/OG2 <6> (io), R2 I/OG2 <5> (io), R3 I/OG2 <4> (io), R18 I/OG2 <20> (io), R19 I/OG2 <19> (io), R20 I/OG2 <18> (io), T1 I/OG2 <3> (io), T2 I/OG2 <2> (io), T3 I/OG2 <1> (io), T18 I/OG2 <23> (io), T19 I/OG2 <22> (io), T20 I/OG2 <21> (io), U1 I/OG2 <0> (io)
part C pins: A7 VCCIO (power), A8 VCCIO (power), A9 NC, A20 VCCIO (power), B16 VCCIO (power), C5 VCCIO (power), C12 VCCIO (power), D4 GND (power), D9 VCC (power), D10 VCC (power), D11 VCC (power), D12 VCC (power), D16 GND (power), D17 GND (power), E4 VCCIO (power), G20 VCCIO (power), H4 VCCIO (power), J4 VCC (power), J9 GND (power), J10 GND (power), J11 GND (power), J12 GND (power), J17 VCC (power), K4 VCC (power), K9 GND (power), K10 GND (power), K11 GND (power), K12 GND (power), K17 VCC (power), L4 VCC (power), L9 GND (power), L10 GND (power), L11 GND (power), L12 GND (power), L17 VCC (power), M1 VCCIO (power), M4 VCC (power), M9 GND (power), M10 GND (power), M11 GND (power), M12 GND (power), M17 VCC (power), N17 VCCIO (power), U2 VCCIO (power), U4 GND (power), U9 VCC (power), U10 VCC (power), U11 VCC (power), U12 VCC (power), U17 GND (power), U20 VCCIO (power), V2 VCCIO (power), V6 VCCIO (power), V17 NC, W7 VCCIO (power), W8 VCCIO (power), W9 NC, W16 VCCIO (power), W19 VCCIO (power), Y13 VCCIO (power)

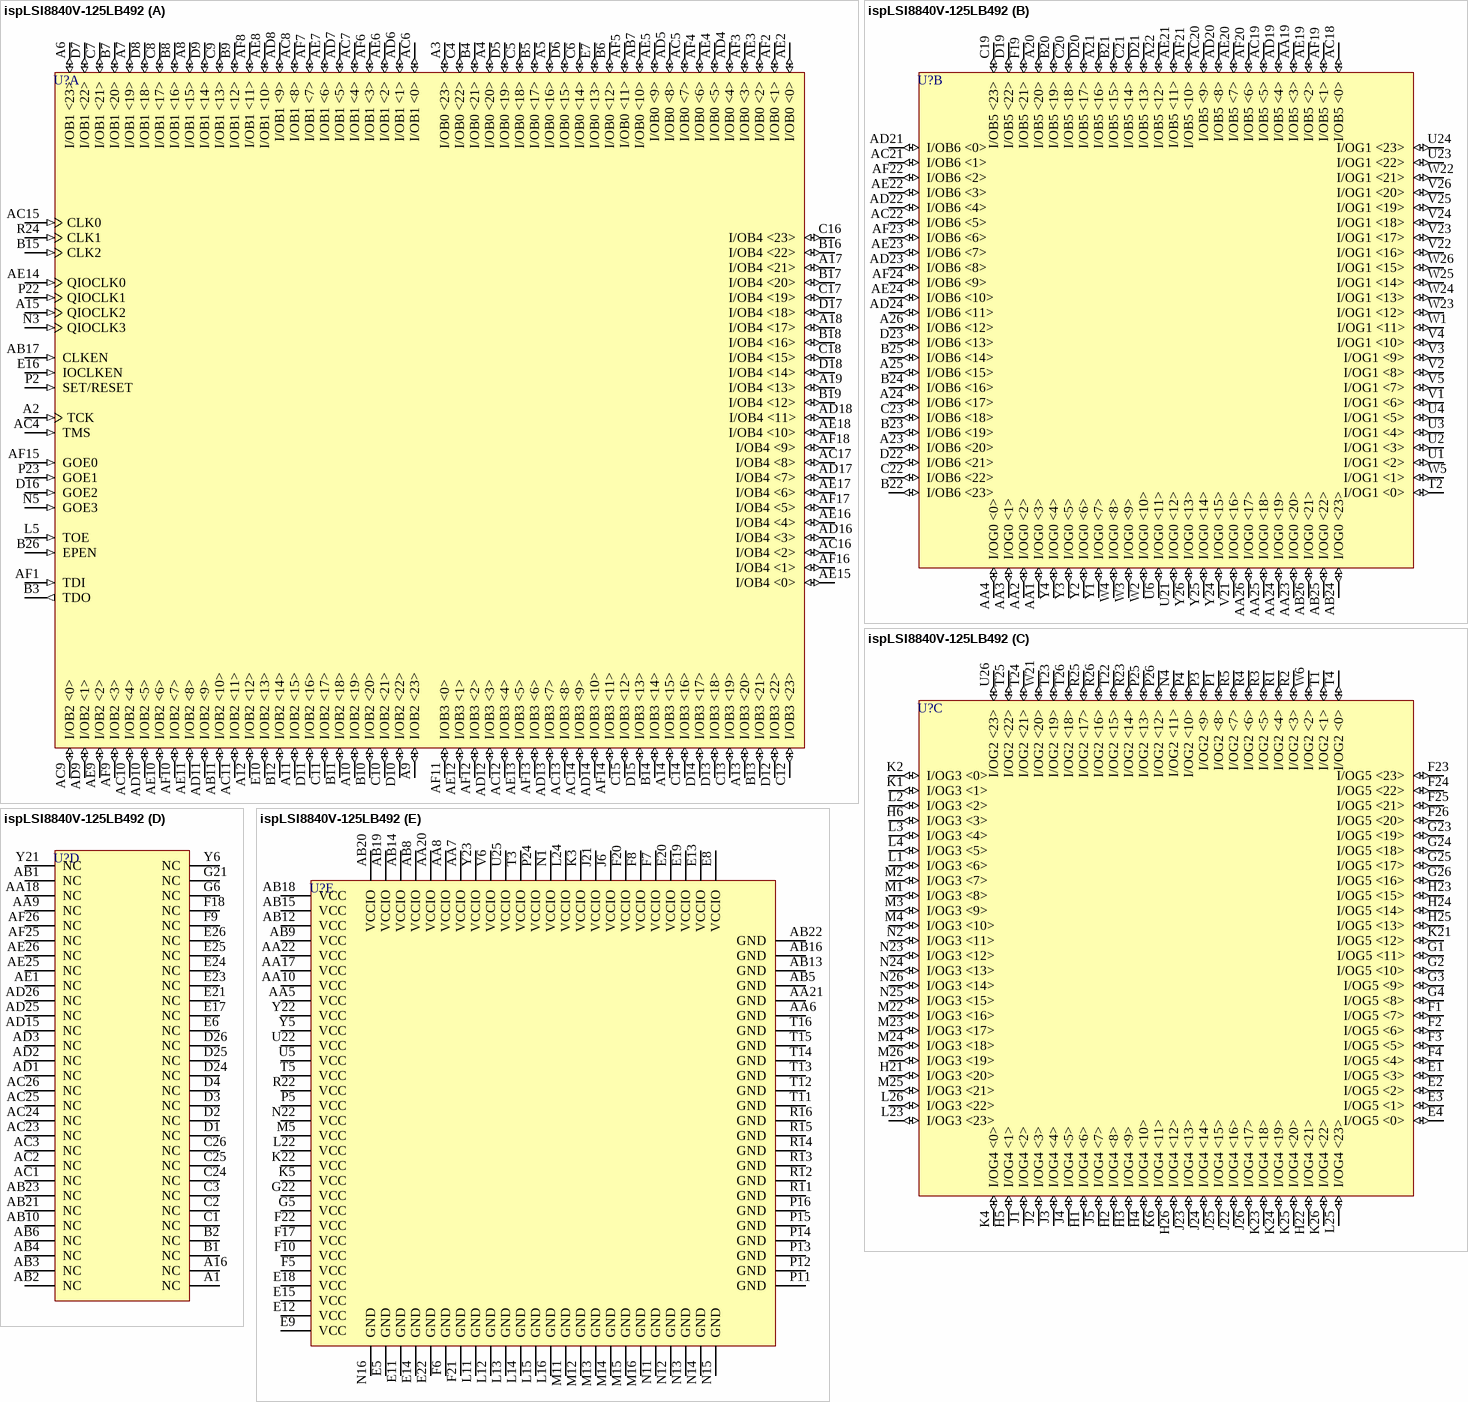
[diagram p225: symbol ispLSI8840V-125LB492]